# Altium footprint library Components.PcbLib: 41 footprints (part 2 of 3)
Each footprint in its own frame and in the unit in brackets; x right, y up, seen from the top. Pads: shape width x height; smd on the part's side, far side on the other; paste and mask are expansions set on the pad; w line width, h text height; cw(c..) or ccw(c..) is an arc to the next point about the centre after c.
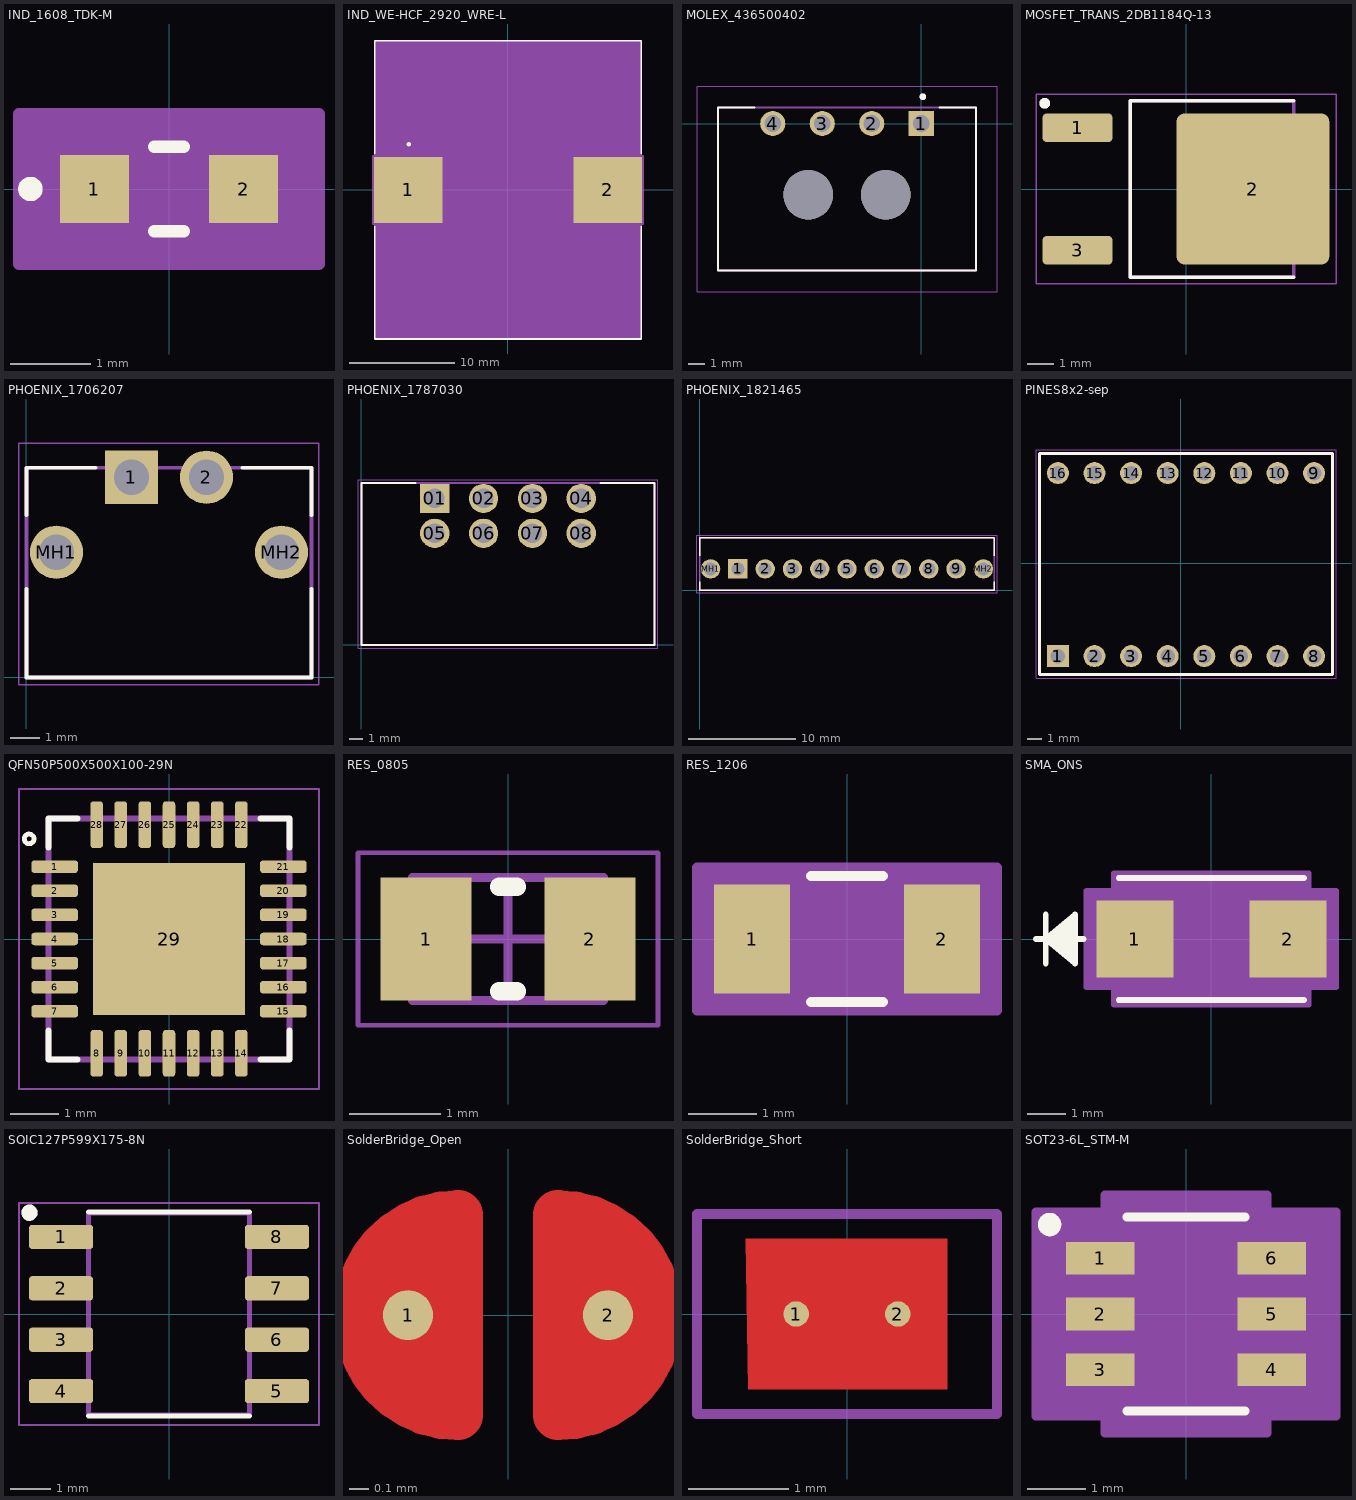
[diagram p1: the footprints below, top view; thin cyan lines are the x and y axes]

## IND_1608_TDK-M [mm]
pads (2):
  rect 0.859x0.851 smd paste+0 mask+0: 1(-0.929,0) 2(0.929,0)
Top Overlay:
  circle w0.152: c-1.725,0 r0.076
  lines w0.152: -0.183,-0.527 0.183,-0.527 ; -0.183,0.527 0.183,0.527
Mechanical 13:
  circle w0: c-0.802,0 r0.076
  lines w0.025: -0.8,-0.4 -0.8,0.4 ; -0.8,-0.4 -0.5,-0.4 -0.5,0.4 -0.8,0.4 ; -0.8,-0.4 0.8,-0.4 ; -0.8,-0.4 -0.8,0.4 ; -0.8,0.4 0.8,0.4 ; 0.8,-0.4 0.5,-0.4 0.5,0.4 0.8,0.4 ; 0.8,-0.4 0.8,0.4 ; 0.8,-0.4 0.8,0.4
Mechanical 15:
  region: 1.867,-0.933 -1.867,-0.933 -1.867,0.933 1.867,0.933
  lines w0.152: -1.867,-0.933 -1.867,0.933 1.867,0.933 1.867,-0.933 -1.867,-0.933
3D body "IND_1608_TDK.step": height 0.8, standoff 0, extent -0.8,-0.4 0.8,0.4

## IND_WE-HCF_2920_WRE-L [mil]
pads (2):
  rect 256x246 smd paste+0 mask+0: 1(-372,0) 2(372,0)
Top Overlay:
  circle w7.87: c-370.08,170.28 r3.94
  lines w6: -497,-136.1 -497,-556 497,-556 497,-136.1 ; -497,136.1 -497,556 497,556 497,136.1
Mechanical 13:
  circle w0: c-244,0 r3
  circle w7.87: c-370.08,170.28 r3.94
  lines w0: -12,551 ccw(c0,551) 12,551
  lines w1: -492,-551 -492,551 492,551 492,-551 -492,-551
Mechanical 15:
  region: -496,-127 -504,-127 -504,127 -496,127 -496,555 496,555 496,127 504,127 504,-127 496,-127 496,-555 -496,-555
  lines w6: -504,-127 -496,-127 -496,-555 496,-555 496,-127 504,-127 504,127 496,127 496,555 -496,555 -496,127 -504,127 -504,-127
3D body "IND_WE-HCF_2920_WRE.step": height 807.09, standoff 0, extent -492.01,-550.98 492.01,550.98

## MOLEX_436500402 [mm]
height 5.57
pads (6):
  rect 1.52x1.52 / inner round 1.52 / far side rect 1.52x1.52 hole 1.02 mask+0.076: 1(0,0)
  round 1.52 hole 1.02 mask+0.076: 2(-3,0) 3(-6,0) 4(-9,0)
  round 3 hole 3 unplated mask+0.076: ""(-6.85,-4.32) ""(-2.15,-4.32)
Top Overlay:
  circle w0.2: c0.1,1.625 r0.1
  lines w0.127: -10.11,0.98 -12.325,0.98 -12.325,-8.92 3.325,-8.92 3.325,0.98 1.11,0.98
Mechanical 13:
  circle w0.2: c0.1,1.625 r0.1
  lines w0.127: -12.325,-8.92 -12.325,0.98 3.325,0.98 3.325,-8.92 -12.325,-8.92
Mechanical 15:
  lines w0.05: -13.595,-10.19 -13.595,2.25 4.595,2.25 4.595,-10.19 -13.595,-10.19
3D body "436500402.STEP": height 5.57, standoff -3.34, extent -12.375,-8.9 3.275,1

## MOSFET_TRANS_2DB1184Q-13 [mm]
pads (3):
  rrect25% 2.6x1.06 smd: 1(-4.05,2.286) 3(-4.05,-2.286)
  rrect10% 5.7x5.632 smd paste-4: 2(2.5,0)
Top Overlay:
  circle w0.2: c-5.275,3.2 r0.1
  lines w0.127: 4.025,-3.29 -2.075,-3.29 -2.075,3.29 4.025,3.29
Top Paste:
  region: 3.175,-0.66 1.825,-0.66 1.825,0.66 3.175,0.66
  region: 1.275,-0.66 -0.075,-0.66 -0.075,0.66 1.275,0.66
  region: 5.075,-0.66 3.725,-0.66 3.725,0.66 5.075,0.66
  region: 3.175,1.21 1.825,1.21 1.825,2.53 3.175,2.53
  region: 1.275,1.21 -0.075,1.21 -0.075,2.53 1.275,2.53
  region: 5.075,1.21 3.725,1.21 3.725,2.53 5.075,2.53
  region: 3.175,-2.53 1.825,-2.53 1.825,-1.21 3.175,-1.21
  region: 1.275,-2.53 -0.075,-2.53 -0.075,-1.21 1.275,-1.21
  region: 5.075,-2.53 3.725,-2.53 3.725,-1.21 5.075,-1.21
Mechanical 13:
  circle w0.2: c-5.275,3.2 r0.1
  lines w0.127: -2.075,-3.29 -2.075,3.29 4.025,3.29 4.025,-3.29 -2.075,-3.29
Mechanical 15:
  lines w0.05: -5.6,-3.54 -5.6,3.54 5.6,3.54 5.6,-3.54 -5.6,-3.54
3D body "DMT10H010LK3-13.stp": height 2.29, standoff -0.09, extent -4.871,-3.291 5.05,3.29

## PHOENIX_1706207 [mm]
height 4.95
pads (4):
  rect 1.8x1.8 / inner round 1.8 / far side rect 1.8x1.8 hole 1.2: 1(3.56,6.78)
  round 1.8 hole 1.2: 2(6.1,6.78) MH1(1.02,4.24) MH2(8.64,4.24)
Top Overlay:
  lines w0.127: 0,3 0,0 9.66,0 9.66,3 ; 0,5.5 0,7.1 2.34,7.1 ; 7.32,7.1 9.66,7.1 9.66,5.5
Mechanical 13:
  lines w0.127: 0,0 9.66,0 9.66,7.1 0,7.1 0,0
Mechanical 15:
  lines w0.05: -0.25,-0.25 -0.25,7.93 9.91,7.93 9.91,-0.25 -0.25,-0.25
3D body "1706207.stp": height 4.85, standoff -2, extent 0.04,0 9.71,7.376

## PHOENIX_1787030 [mm]
pads (8):
  rect 2.1x2.1 / inner round 2.1 / far side rect 2.1x2.1 hole 1.4: 01(5.25,10.5)
  round 2.1 hole 1.4: 02(8.75,10.5) 03(12.25,10.5) 04(15.75,10.5) 05(5.25,8) 06(8.75,8) 07(12.25,8) 08(15.75,8)
Top Overlay:
  lines w0.127: 3.88,11.6 0,11.6 0,0 21,0 21,11.6 17.12,11.6
Mechanical 13:
  lines w0.127: 0,0 21,0 21,11.6 0,11.6 0,0
Mechanical 15:
  lines w0.05: -0.25,-0.25 21.25,-0.25 21.25,11.85 -0.25,11.85 -0.25,-0.25
3D body "1787030.step": height 10.83, standoff -2, extent 0.025,-0.05 21.025,11.55

## PHOENIX_1821465 [mm]
pads (11):
  rect 1.8x1.8 / inner round 1.8 / far side rect 1.8x1.8 hole 1.2: 1(3.56,1.97)
  round 1.8 hole 1.2: 2(6.1,1.97) 3(8.64,1.97) 4(11.18,1.97) 5(13.72,1.97) 6(16.26,1.97) 7(18.8,1.97) 8(21.34,1.97) 9(23.88,1.97) MH1(1.02,1.97) MH2(26.42,1.97)
Top Overlay:
  lines w0.127: 0,0.75 0,0 27.44,0 27.44,0.75 ; 0,3.19 0,4.85 27.44,4.85 27.44,3.19
Mechanical 13:
  lines w0.127: 0,0 27.44,0 27.44,4.85 0,4.85 0,0
Mechanical 15:
  lines w0.05: -0.25,-0.25 -0.25,5.1 27.69,5.1 27.69,-0.25 -0.25,-0.25
3D body "1821465.step": height 7.1, standoff -2, extent 0.05,-0.025 27.5,4.825

## PINES8x2-sep [mil]
pads (16):
  rect 60x60 / inner round 60 / far side rect 60x60 hole 40: 1(-335.98,-253.15)
  round 60 hole 40: 2(-235.98,-253.15) 3(-135.98,-253.15) 4(-35.98,-253.15) 5(64.02,-253.15) 6(164.02,-253.15) 7(264.02,-253.15) 8(364.02,-253.15) 9(364.02,246.85) 10(264.02,246.85) 11(164.02,246.85) 12(64.02,246.85) 13(-35.98,246.85) 14(-135.98,246.85) 15(-235.98,246.85) 16(-335.98,246.85)
Top Overlay:
  lines w7.87: -385.98,-303.15 -385.98,300.2 414.02,300.2 414.02,-303.15 -385.98,-303.15
Mechanical 13:
  lines w3.94: -385.98,-303.15 414.02,-303.15 414.02,301.18 -385.98,301.18 -385.98,-303.15
Mechanical 15:
  lines w1.97: -395.83,-312.99 423.86,-312.99 423.86,310.04 -395.83,310.04 -395.83,-312.99
3D body "61300811821+%28rev1%29.stp": height 336.61, standoff -120.53, extent -394.09,198.82 425.59,297.24
3D body "61300811821+%28rev1%29.stp": height 336.61, standoff -120.53, extent -394.09,-301.18 425.59,-202.76
3D body "A4988 STEPPER MOTOR DRIVER CARRIER--3DModel-STEP-56544.STEP": height 570.58, standoff 102.58, extent -400,-300 400,300

## QFN50P500X500X100-29N [mm]
pads (29):
  rrect50% 0.97x0.26 smd: 1(-2.37,1.5) 2(-2.37,1) 3(-2.37,0.5) 4(-2.37,0) 5(-2.37,-0.5) 6(-2.37,-1) 7(-2.37,-1.5) 15(2.37,-1.5) 16(2.37,-1) 17(2.37,-0.5) 18(2.37,0) 19(2.37,0.5) 20(2.37,1) 21(2.37,1.5)
  rrect50% 0.26x0.97 smd: 8(-1.5,-2.37) 9(-1,-2.37) 10(-0.5,-2.37) 11(0,-2.37) 12(0.5,-2.37) 13(1,-2.37) 14(1.5,-2.37) 22(1.5,2.37) 23(1,2.37) 24(0.5,2.37) 25(0,2.37) 26(-0.5,2.37) 27(-1,2.37) 28(-1.5,2.37)
  rect 3.15x3.15 smd paste-0.585: 29(0,0)
Top Overlay:
  circle w0.1: c-2.9,2.075 r0.1
  lines w0.127: -2.5,-1.9 -2.5,-2.5 -1.9,-2.5 ; -2.5,1.9 -2.5,2.5 -1.9,2.5 ; 1.9,-2.5 2.5,-2.5 2.5,-1.9 ; 1.9,2.5 2.5,2.5 2.5,1.9
Mechanical 13:
  lines w0.127: -2.5,-2.5 -2.5,2.5 2.5,2.5 2.5,-2.5 -2.5,-2.5
Mechanical 15:
  lines w0.05: -3.11,-3.11 -3.11,3.11 3.11,3.11 3.11,-3.11 -3.11,-3.11
3D body "step_temp.STEP": height 1, standoff 0, extent -2.5,-2.5 2.5,2.5

## RES_0805 [mm] "Chip Resistor, 2-Leads, Body 2.00x1.25mm, IPC Medium Density"
height 0.6
pads (2):
  rect 1x1.35 smd: 1(-0.9,0) 2(0.9,0)
Top Overlay:
  lines w0.2: -0.1,-0.575 0.1,-0.575 ; -0.1,0.575 0.1,0.575
Top Courtyard:
  lines w0.05: -1.65,-0.95 -1.65,0.95 1.65,0.95 1.65,-0.95 -1.65,-0.95
  lines w0.1: -0.5,0 0.5,0 ; 0,-0.5 0,0.5
Top Assembly:
  lines w0.1: -1.05,-0.675 -1.05,0.675 1.05,0.675 1.05,-0.675 -1.05,-0.675
3D body: height 0.6, standoff 0, extent -0.7,-0.675 0.7,0.675
3D body: height 0.6, standoff 0, extent -1.05,-0.675 -0.7,0.675
3D body: height 0.6, standoff 0, extent 0.7,-0.675 1.05,0.675

## RES_1206 [mil] "RC1206N_YAG"
pads (2):
  rect 44x63 smd paste+0 mask+0: 1(-55,0) 2(55,0)
Top Overlay:
  lines w6: -20.89,-36.5 20.89,-36.5 ; -20.89,36.5 20.89,36.5
Mechanical 13:
  lines w1: -63,-31.5 -63,31.5 ; -63,-31.5 63,-31.5 ; -63,-31.5 -33,-31.5 -33,31.5 -63,31.5 ; -63,-31.5 -63,31.5 ; -63,31.5 63,31.5 ; 63,-31.5 63,31.5 ; 63,-31.5 63,31.5 ; 63,-31.5 33,-31.5 33,31.5 63,31.5
Mechanical 15:
  region: 87,-41.5 -87,-41.5 -87,41.5 87,41.5
  lines w6: -87,-41.5 87,-41.5 87,41.5 -87,41.5 -87,-41.5
3D body "RC1206N_YAG.step": height 27.99, standoff 0, extent -62.99,-31.5 62.99,31.5

## SMA_ONS [mil]
pads (2):
  rect 79x79 smd paste+0 mask+0: 1(-78.5,0) 2(78.5,0)
Top Overlay:
  lines w6: -180,0 -131.1,0 ; -170,-25 -170,25 ; -140,-20 -170,0 ; -140,-15 -170,0 ; -140,-10 -170,0 ; -140,-5 -170,0 ; -140,5 -170,0 ; -140,10 -170,0 ; -140,15 -170,0 ; -140,20 -170,0 ; -95,-62.5 95,-62.5 ; -95,62.5 95,62.5 ; -170,0 -140,-25 -140,25 -170,0
Mechanical 13:
  lines w1: -180,0 -130,0 ; -170,-25 -170,25 ; -140,-20 -170,0 ; -140,-15 -170,0 ; -140,-10 -170,0 ; -140,-5 -170,0 ; -140,5 -170,0 ; -140,10 -170,0 ; -140,15 -170,0 ; -140,20 -170,0 ; -170,0 -140,-25 -140,25 -170,0 ; -90,-57.5 90,-57.5 90,57.5 -90,57.5 -90,-57.5
Mechanical 15:
  region: -100,-49.5 -128,-49.5 -128,49.5 -100,49.5 -100,67.5 100,67.5 100,49.5 128,49.5 128,-49.5 100,-49.5 100,-67.5 -100,-67.5
  lines w6: -128,-49.5 -128,49.5 -100,49.5 -100,67.5 100,67.5 100,49.5 128,49.5 128,-49.5 100,-49.5 100,-67.5 -100,-67.5 -100,-49.5 -128,-49.5
3D body "SMA_ONS.step": height 97.01, standoff 0, extent -90,-57.48 90,57.48

## SOIC127P599X175-8N [mm]
pads (8):
  rrect25% 1.58x0.6 smd: 1(-2.67,1.905) 2(-2.67,0.635) 3(-2.67,-0.635) 4(-2.67,-1.905) 5(2.67,-1.905) 6(2.67,-0.635) 7(2.67,0.635) 8(2.67,1.905)
Top Overlay:
  circle w0.2: c-3.45,2.505 r0.1
  lines w0.127: -1.995,-2.525 1.995,-2.525 ; -1.995,2.525 1.995,2.525
Mechanical 13:
  circle w0.2: c-3.45,2.505 r0.1
  lines w0.127: -1.995,-2.5 1.995,-2.5 1.995,2.5 -1.995,2.5 -1.995,-2.5
Mechanical 15:
  lines w0.05: -3.71,-2.75 3.71,-2.75 3.71,2.75 -3.71,2.75 -3.71,-2.75
3D body "step_temp.STEP": height 1.75, standoff 0, extent -3,-2.45 3,2.45

## SolderBridge_Open [mil]
pads (2):
  round 10 smd mask+0: 1(-20,0) 2(20,0)
Top Layer:
  region: 10,20 21.96,18.4 29.53,10.83 29.53,-9.84 19.37,-20 10,-20
  region: -9.02,-19.51 -20.97,-17.9 -28.54,-10.33 -28.54,10.33 -18.39,20.49 -9.02,20.49
  lines w10: -10,-20 cw(c-10,0) -10,20 -10,-20 ; 10,-20 ccw(c10,0) 10,20 10,-20
Top Solder:
  circle w29: c-10,0 r11
  circle w29: c10,0 r11
  lines w10: -9.02,20.49 9.51,20.49
  lines w11: -10,-20 10,-20

## SolderBridge_Short [mil]
pads (2):
  round 10 smd mask+0: 1(-20,0) 2(20,0)
Top Layer:
  region: 10,20 21.96,18.4 29.53,10.83 29.53,-9.84 19.37,-20 10,-20
  region: -9.02,-19.51 -20.97,-17.9 -28.54,-10.33 -28.54,10.33 -18.39,20.49 -9.02,20.49
  pour cut-out: -13.78,29.53 39.37,29.53 39.37,28.54 39.37,-29.53 -38.82,-29.53 -39.92,29.53
  lines w6: -10,0 10,0
  lines w10: -10,-20 cw(c-10,0) -10,20 -10,-20 ; 10,-20 ccw(c10,0) 10,20 10,-20
Top Solder:
  circle w29: c-10,0 r15
  circle w29: c10,0 r15
  lines w10: -9.02,24.49 9.51,24.49
  lines w11: -10,-24 10,-24
Top Courtyard:
  lines w3.94: -59.06,-39.37 59.06,-39.37 59.06,39.37 -59.06,39.37 -59.06,-39.37
Bottom Courtyard:
  lines w3.94: -59.06,-39.37 59.06,-39.37 59.06,39.37 -59.06,39.37 -59.06,-39.37

## SOT23-6L_STM-M [mm]
pads (6):
  rect 1.172x0.558 smd paste+0 mask+0: 1(-1.462,0.95) 2(-1.462,0) 3(-1.462,-0.95) 4(1.462,-0.95) 5(1.462,0) 6(1.462,0.95)
Top Overlay:
  circle w0.2: c-2.325,1.525 r0.1
  lines w0.152: -1.003,-1.651 1.003,-1.651 ; -1.003,1.651 1.003,1.651
Mechanical 13:
  circle w0.2: c-2.325,1.525 r0.1
  lines w0: -0.305,1.524 ccw(c0,1.524) 0.305,1.524
  lines w0.025: -1.499,-1.204 -1.499,-0.696 -0.876,-0.696 -0.876,-1.204 -1.499,-1.204 ; -1.499,-0.254 -1.499,0.254 -0.876,0.254 -0.876,-0.254 -1.499,-0.254 ; -1.499,0.696 -1.499,1.204 -0.876,1.204 -0.876,0.696 -1.499,0.696 ; -0.876,-1.524 0.876,-1.524 0.876,1.524 -0.876,1.524 -0.876,-1.524 ; 0.876,-1.204 0.876,-0.696 1.499,-0.696 1.499,-1.204 0.876,-1.204 ; 0.876,-0.254 0.876,0.254 1.499,0.254 1.499,-0.254 0.876,-0.254 ; 0.876,0.696 0.876,1.204 1.499,1.204 1.499,0.696 0.876,0.696
  text "*" at -0.813,0.178 h1.27
Mechanical 15:
  region: -1.384,-1.737 -2.557,-1.737 -2.557,1.737 -1.384,1.737 -1.384,2.032 1.384,2.032 1.384,1.737 2.557,1.737 2.557,-1.737 1.384,-1.737 1.384,-2.032 -1.384,-2.032
  lines w0.152: -2.557,-1.737 -2.557,1.737 -1.384,1.737 -1.384,2.032 1.384,2.032 1.384,1.737 2.557,1.737 2.557,-1.737 1.384,-1.737 1.384,-2.032 -1.384,-2.032 -1.384,-1.737 -2.557,-1.737
3D body "SOT23-6L_STM.step": height 1.45, standoff 0, extent -1.499,-1.524 1.499,1.524